# Altium footprint library dcdc_ldo_ref.pcblib: 40 footprints (part 1 of 3)
Each footprint in its own frame and in the unit in brackets; x right, y up, seen from the top. Pads: shape width x height; smd on the part's side, far side on the other; paste and mask are expansions set on the pad; w line width, h text height; cw(c..) or ccw(c..) is an arc to the next point about the centre after c.
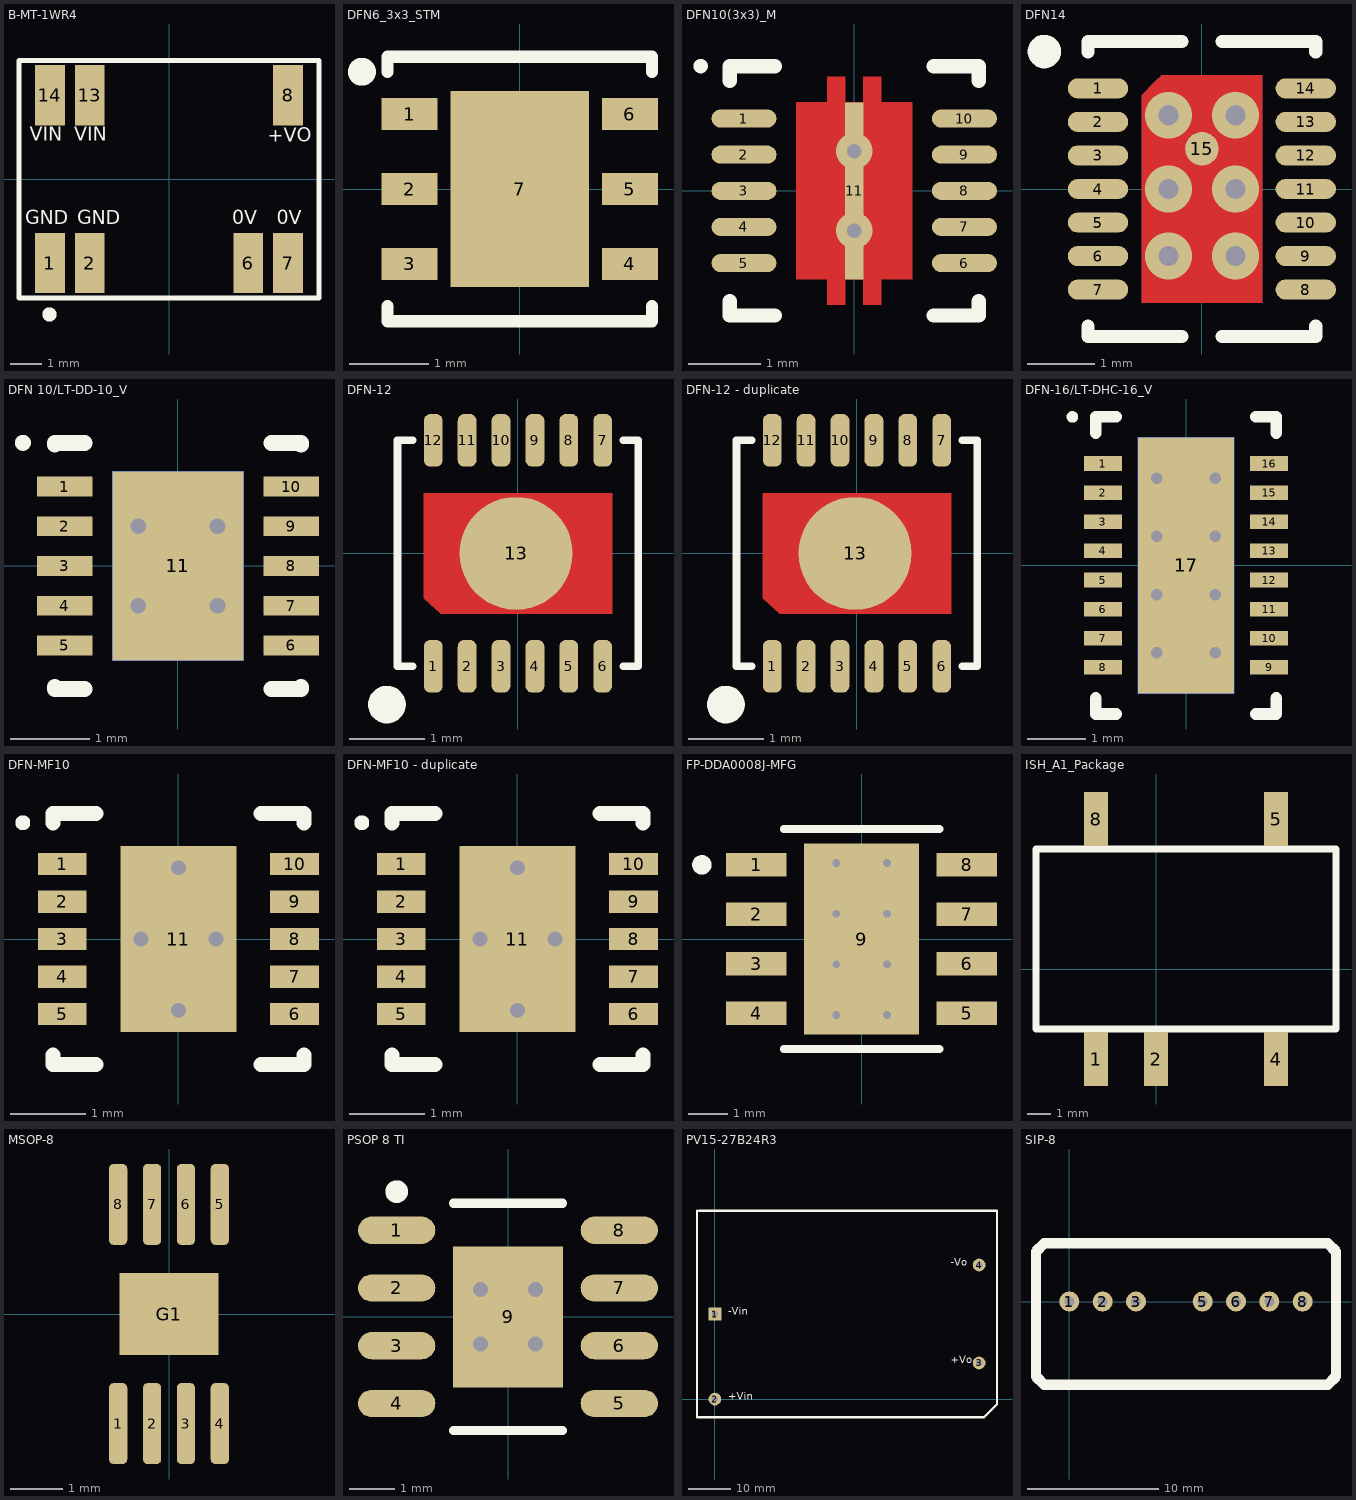
[diagram p0: the footprints below, top view; thin cyan lines are the x and y axes]

## B-MT-1WR4 [mm] "dc-dc converter 1W"
pads (7):
  rect 0.95x1.925 smd paste+0 mask-0.075: 1(-3.81,-2.685) 2(-2.54,-2.685) 6(2.54,-2.685) 7(3.81,-2.685) 8(3.81,2.688) 13(-2.54,2.688) 14(-3.81,2.688)
Top Overlay:
  circle w0.254: c-3.825,-4.325 r0.1
  lines w0.152: -4.8,-3.8 -4.8,3.8 4.8,3.8 4.8,-3.8 -4.8,-3.8
  text "VIN" at -4.45,1.075 h0.76
  text "VIN" at -3.025,1.075 h0.76
  text "+VO" at 3.16,1.046 h0.76
  text "0V" at 3.446,-1.593 h0.76
  text "0V" at 2.025,-1.593 h0.76
  text "GND" at -2.938,-1.6 h0.76
  text "GND" at -4.6,-1.6 h0.76
3D body "B05xxMT-1WR4.stp": height 3.11, standoff 0, extent -4.5,-3.504 4.5,3.5

## DFN6_3x3_STM [mil]
pads (7):
  rect 28x16 smd paste+0 mask+0: 1(-55,37.4) 2(-55,0) 3(-55,-37.4) 4(55,-37.4) 5(55,0) 6(55,37.4)
  rect 69x98 smd paste+0 mask+0: 7(0,0)
Top Overlay:
  circle w10: c-78.74,58.5 r1.97
  lines w6: -66,-58.5 -66,-66 66,-66 66,-58.5 ; -66,58.5 -66,66 66,66 66,58.5
3D body "DFN6_3X3_STM.step": height 39.09, standoff 0, extent -60.98,-60.98 60.98,60.98

## DFN10(3x3)_M [mm] "SON, 10-Leads, Body 3x3mm, Pitch 0.5mm, Thermal Pad 2.45x1.6mm, IPC Low Density"
height 1
pads (11):
  oval 0.9x0.25 smd: 1(-1.525,1) 2(-1.525,0.5) 3(-1.525,0) 4(-1.525,-0.5) 5(-1.525,-1) 6(1.525,-1) 7(1.525,-0.5) 8(1.525,0) 9(1.525,0.5) 10(1.525,1)
  rect 0.25x2.45 smd paste+0 mask+0: 11(0,0)
via 0,0.55 diameter 0.5 hole 0.2
via 0,-0.55 diameter 0.5 hole 0.2
Top Layer:
  region: -0.8,-1.225 -0.375,-1.225 -0.375,-1.575 -0.125,-1.575 -0.125,-1.225 0.125,-1.225 0.125,-1.575 0.375,-1.575 0.375,-1.225 0.8,-1.225 0.8,1.225 0.375,1.225 0.375,1.575 0.125,1.575 0.125,1.225 -0.125,1.225 -0.125,1.575 -0.375,1.575 -0.375,1.225 -0.8,1.225
Top Overlay:
  circle w0.1: c-2.125,1.725 r0.05
  lines w0.2: -1.725,-1.525 -1.725,-1.725 -1.1,-1.725 ; -1.725,1.525 -1.725,1.725 -1.1,1.725 ; 1.1,-1.725 1.725,-1.725 1.725,-1.525 ; 1.1,1.725 1.725,1.725 1.725,1.525
3D body "User Library-My-DFN-10-3x3-0_5.STEP": height 0.8, standoff 0, extent -1.57,-1.55 1.55,1.55

## DFN14 [mm]
pads (15):
  oval 0.9x0.3 smd: 1(-1.55,1.5) 2(-1.55,1) 3(-1.55,0.5) 4(-1.55,0) 5(-1.55,-0.5) 6(-1.55,-1) 7(-1.55,-1.5) 8(1.55,-1.5) 9(1.55,-1) 10(1.55,-0.5) 11(1.55,0) 12(1.55,0.5) 13(1.55,1) 14(1.55,1.5)
  round 0.5 smd: 15(0,0.6)
via 0.5,-1 diameter 0.7 hole 0.3
via -0.5,-1 diameter 0.7 hole 0.3
via 0.5,0 diameter 0.7 hole 0.3
via -0.5,0 diameter 0.7 hole 0.3
via 0.5,1.1 diameter 0.7 hole 0.3
via -0.5,1.1 diameter 0.7 hole 0.3
Top Layer:
  region: -0.9,-1.7 -0.9,1.4 -0.7,1.6 -0.6,1.7 0.9,1.7 0.9,-1.7
Bottom Layer:
  region: -0.9,-1.7 -0.9,1.4 -0.7,1.6 -0.6,1.7 0.9,1.7 0.9,-1.7
Top Overlay:
  circle w0.25: c-2.35,2.05 r0.125
  lines w0.2: -1.7,-2.05 -1.7,-2.2 -0.3,-2.2 ; -1.7,2.05 -1.7,2.2 -0.3,2.2 ; 0.3,-2.2 1.7,-2.2 1.7,-2.05 ; 0.3,2.2 1.7,2.2 1.7,2.05
Top Solder:
  region: -0.9,-1.7 -0.9,1.4 -0.7,1.6 -0.6,1.7 0.9,1.7 0.9,-1.7
3D body "User Library-LT3479EDE#PBF-2.step": height 0.75, standoff 0, extent -1.5,-2 1.5,2

## DFN 10/LT-DD-10_V [mm] "SON, 10-Leads, Body 3x3mm, Pitch 0.5mm, Thermal Pad 2.38x1.65mm"
height 0.8
pads (12):
  rect 0.7x0.25 smd mask+0.102: 1(-1.425,1) 2(-1.425,0.5) 3(-1.425,0) 4(-1.425,-0.5) 5(-1.425,-1) 6(1.425,-1) 7(1.425,-0.5) 8(1.425,0) 9(1.425,0.5) 10(1.425,1)
  rect 1.65x2.38 smd mask+0.102: 11(0,0)
  rect 1.65x2.38 smd far side mask+0.102: 11(0,0)
via 0.5,-0.5 diameter 0.5 hole 0.2
via -0.5,-0.5 diameter 0.5 hole 0.2
via 0.5,0.5 diameter 0.5 hole 0.2
via -0.5,0.5 diameter 0.5 hole 0.2
Top Overlay:
  circle w0.1: c-1.95,1.55 r0.05
  lines w0.2: -1.55,-1.525 -1.55,-1.55 -1.175,-1.55 ; -1.55,1.525 -1.55,1.55 -1.175,1.55 ; 1.175,-1.55 1.55,-1.55 1.55,-1.525 ; 1.175,1.55 1.55,1.55 1.55,1.525
3D body "User Library-DFN10-1.STEP": height 0.8, standoff 0, extent -1.51,-1.5 1.51,1.5

## DFN-12 [mm]
pads (13):
  rrect70% 0.25x0.7 smd mask+0.05: 1(-1.125,-1.5) 2(-0.675,-1.5) 3(-0.225,-1.5) 4(0.225,-1.5) 5(0.675,-1.5) 6(1.125,-1.5) 7(1.125,1.5) 8(0.675,1.5) 9(0.225,1.5) 10(-0.225,1.5) 11(-0.675,1.5) 12(-1.125,1.5)
  round 1.5 smd paste+0 mask+0: 13(-0.025,0)
Top Layer:
  region: -1.25,0.8 1.25,0.8 1.25,-0.8 -1.025,-0.8 -1.25,-0.6
Top Overlay:
  circle w0.25: c-1.74,-2.009 r0.125
  lines w0.1: -1.4,-1.5 -1.6,-1.5 -1.6,1.5 -1.4,1.5 ; 1.4,-1.5 1.6,-1.5 1.6,1.5 1.4,1.5
Top Solder:
  region: -1.25,0.8 1.25,0.8 1.25,-0.8 -1.025,-0.8 -1.25,-0.6
3D body "User Library-DFN12(3x3).step": height 0.76, standoff 0, extent -1.5,-1.5 1.5,1.502

## DFN-12 - duplicate [mm]
pads (13):
  rrect70% 0.25x0.7 smd mask+0.05: 1(-1.125,-1.5) 2(-0.675,-1.5) 3(-0.225,-1.5) 4(0.225,-1.5) 5(0.675,-1.5) 6(1.125,-1.5) 7(1.125,1.5) 8(0.675,1.5) 9(0.225,1.5) 10(-0.225,1.5) 11(-0.675,1.5) 12(-1.125,1.5)
  round 1.5 smd paste+0 mask+0: 13(-0.025,0)
Top Layer:
  region: -1.25,0.8 1.25,0.8 1.25,-0.8 -1.025,-0.8 -1.25,-0.6
Top Overlay:
  circle w0.25: c-1.74,-2.009 r0.125
  lines w0.1: -1.4,-1.5 -1.6,-1.5 -1.6,1.5 -1.4,1.5 ; 1.4,-1.5 1.6,-1.5 1.6,1.5 1.4,1.5
Top Solder:
  region: -1.25,0.8 1.25,0.8 1.25,-0.8 -1.025,-0.8 -1.25,-0.6
3D body "User Library-DFN12(3x3).step": height 0.76, standoff 0, extent -1.5,-1.5 1.5,1.502

## DFN-16/LT-DHC-16_V [mm] "SON, 16-Leads, Body 5x3mm, Pitch 0.5mm, Thermal Pad 4.4X1.65mm"
height 0.8
pads (18):
  rect 0.65x0.25 smd: 1(-1.425,1.75) 2(-1.425,1.25) 3(-1.425,0.75) 4(-1.425,0.25) 5(-1.425,-0.25) 6(-1.425,-0.75) 7(-1.425,-1.25) 8(-1.425,-1.75) 9(1.425,-1.75) 10(1.425,-1.25) 11(1.425,-0.75) 12(1.425,-0.25) 13(1.425,0.25) 14(1.425,0.75) 15(1.425,1.25) 16(1.425,1.75)
  rect 1.65x4.4 smd: 17(0,0)
  rect 1.65x4.4 smd far side: 17(0,0)
via -0.5,1.5 diameter 0.5 hole 0.2
via 0.5,1.5 diameter 0.5 hole 0.2
via -0.5,0.5 diameter 0.5 hole 0.2
via 0.5,0.5 diameter 0.5 hole 0.2
via -0.5,-0.5 diameter 0.5 hole 0.2
via 0.5,-0.5 diameter 0.5 hole 0.2
via -0.5,-1.5 diameter 0.5 hole 0.2
via 0.5,-1.5 diameter 0.5 hole 0.2
Top Overlay:
  circle w0.1: c-1.95,2.55 r0.05
  lines w0.2: -1.55,-2.275 -1.55,-2.55 -1.2,-2.55 ; -1.55,2.275 -1.55,2.55 -1.2,2.55 ; 1.2,-2.55 1.55,-2.55 1.55,-2.275 ; 1.2,2.55 1.55,2.55 1.55,2.275
3D body "User Library-My-DFN-16-5x3-0_5.STEP": height 0.8, standoff 0, extent -1.56,-2.55 1.56,2.55

## DFN-MF10 [mm] "SON, 10-Leads, Body 3x3mm, Pitch 0.5mm, Microchip Recommended"
height 1
pads (11):
  rect 0.65x0.3 smd: 1(-1.55,1) 2(-1.55,0.5) 3(-1.55,0) 4(-1.55,-0.5) 5(-1.55,-1) 6(1.55,-1) 7(1.55,-0.5) 8(1.55,0) 9(1.55,0.5) 10(1.55,1)
  rect 1.55x2.48 smd: 11(0,0)
via -0.5,0 diameter 0.5 hole 0.2
via 0.5,0 diameter 0.5 hole 0.2
via 0,0.95 diameter 0.5 hole 0.2
via 0,-0.95 diameter 0.5 hole 0.2
Top Overlay:
  circle w0.1: c-2.075,1.55 r0.05
  lines w0.2: -1.675,-1.55 -1.675,-1.675 -1.1,-1.675 ; -1.675,1.55 -1.675,1.675 -1.1,1.675 ; 1.1,-1.675 1.675,-1.675 1.675,-1.55 ; 1.1,1.675 1.675,1.675 1.675,1.55
3D body: height 1, standoff 0, extent -1.524,-1.524 1.524,1.524

## DFN-MF10 - duplicate [mm] "SON, 10-Leads, Body 3x3mm, Pitch 0.5mm, Microchip Recommended"
height 1
pads (11):
  rect 0.65x0.3 smd: 1(-1.55,1) 2(-1.55,0.5) 3(-1.55,0) 4(-1.55,-0.5) 5(-1.55,-1) 6(1.55,-1) 7(1.55,-0.5) 8(1.55,0) 9(1.55,0.5) 10(1.55,1)
  rect 1.55x2.48 smd: 11(0,0)
via -0.5,0 diameter 0.5 hole 0.2
via 0.5,0 diameter 0.5 hole 0.2
via 0,0.95 diameter 0.5 hole 0.2
via 0,-0.95 diameter 0.5 hole 0.2
Top Overlay:
  circle w0.1: c-2.075,1.55 r0.05
  lines w0.2: -1.675,-1.55 -1.675,-1.675 -1.1,-1.675 ; -1.675,1.55 -1.675,1.675 -1.1,1.675 ; 1.1,-1.675 1.675,-1.675 1.675,-1.55 ; 1.1,1.675 1.675,1.675 1.675,1.55
3D body: height 1, standoff 0, extent -1.524,-1.524 1.524,1.524

## FP-DDA0008J-MFG [mm]
pads (9):
  rect 1.55x0.6 smd paste+0 mask+0: 1(-2.7,1.905) 2(-2.7,0.635) 3(-2.7,-0.635) 4(-2.7,-1.905) 5(2.7,-1.905) 6(2.7,-0.635) 7(2.7,0.635) 8(2.7,1.905)
  rect 2.95x4.9 smd paste-1000 mask-1000: 9(0,0)
via -0.65,1.95 diameter 0.5 hole 0.2
via -0.65,0.65 diameter 0.5 hole 0.2
via -0.65,-0.65 diameter 0.5 hole 0.2
via -0.65,-1.95 diameter 0.5 hole 0.2
via 0.65,1.95 diameter 0.5 hole 0.2
via 0.65,0.65 diameter 0.5 hole 0.2
via 0.65,-0.65 diameter 0.5 hole 0.2
via 0.65,-1.95 diameter 0.5 hole 0.2
Top Overlay:
  circle w0.25: c-4.1,1.905 r0.125
  lines w0.2: -2,-2.825 2,-2.825 ; -2,2.825 2,2.825
Top Paste:
  rectangle: -1.3,-1.55 1.3,1.55
Top Solder:
  rectangle: -1.3,-1.55 1.3,1.55
3D body "IC_Texas_Instruments_OPA454AIDDAR_eec.STEP": height 0.25, standoff 0, extent -3.575,-2.75 3.575,2.75

## ISH_A1_Package [mm] "DC-DC XP power"
pads (5):
  rect 1x2.29 smd: 1(-2.54,-3.81) 2(0,-3.81) 4(5.08,-3.81) 5(5.08,6.35) 8(-2.54,6.35)
Top Overlay:
  lines w0.3: -5.08,-2.54 7.62,-2.54 7.62,5.08 -5.08,5.08 -5.08,-2.54
3D body "User Library-ISF_A1_Package.stp": height 6.5, standoff 0, extent -5.08,-4.33 7.62,6.87

## MSOP-8 [mm]
pads (9):
  rrect50% 0.35x1.55 smd: 1(-0.975,-2.1) 2(-0.325,-2.1) 3(0.325,-2.1) 4(0.975,-2.1) 5(0.975,2.1) 6(0.325,2.1) 7(-0.325,2.1) 8(-0.975,2.1)
  rect 1.89x1.57 smd: G1(0,0)
3D body "MSOP-8.step": height 1.09, standoff -0.01, extent -1.5,-2.5 1.5,2.5

## PSOP 8 TI [mm]
pads (9):
  oval 1.7x0.6 smd: 1(-2.45,1.905) 2(-2.45,0.635) 3(-2.45,-0.635) 4(-2.45,-1.905) 5(2.45,-1.905) 6(2.45,-0.635) 7(2.45,0.635) 8(2.45,1.905)
  rect 2.41x3.1 smd: 9(0,0)
via -0.6,0.6 diameter 0.66 hole 0.33
via 0.6,0.6 diameter 0.66 hole 0.33
via 0.6,-0.6 diameter 0.66 hole 0.33
via -0.6,-0.6 diameter 0.66 hole 0.33
Top Overlay:
  circle w0.25: c-2.45,2.755 r0.125
  lines w0.2: -1.2,-2.5 1.2,-2.5 ; -1.2,2.5 1.2,2.5
3D body "User Library-SO8-1.step": height 1.7, standoff -0.05, extent -3.1,-2.5 3.1,2.5

## PV15-27B24R3 [mm] "DC-DC thr"
pads (4):
  rect 3x3 hole 1.5: 1(0,20)
  round 3 hole 1.5: 2(0,0) 3(62.09,8.5) 4(62.09,31.5)
Top Overlay:
  lines w0.5: -4.205,44.25 -4.205,-4.25 63.25,-4.25 66.295,-1.205 66.295,44.25 -3.705,44.25
  text "-Vin" at 3.105,19.238 h3
  text "+Vin" at 3.105,-0.762 h3
  text "+Vo" at 55.429,7.808 h3
  text "-Vo" at 55.429,30.808 h3
3D body "PV15-27BxxR3.stp": height 23.6, standoff 0.1, extent -4,-4 66,44

## SIP-8 [mil]
pads (7):
  round 60 hole 30: 1(0,0) 2(100,0) 3(200,0) 5(400,0) 6(500,0) 7(600,0) 8(700,0)
Top Overlay:
  lines w31.5: -100,-225 -100,0 -100,150 -75,175 775,175 800,150 800,-225 775,-250 -75,-250 -100,-225
3D body "User Library-User Library-TRACO TMR rev3.step": height 389.76, standoff -149.61, extent -79.13,-218.12 779.13,152